# Altium footprint library My_Intlib.PcbLib: 224 footprints (part 4 of 14)
Each footprint in its own frame and in the unit in brackets; x right, y up, seen from the top. Pads: shape width x height; smd on the part's side, far side on the other; paste and mask are expansions set on the pad; w line width, h text height; cw(c..) or ccw(c..) is an arc to the next point about the centre after c.
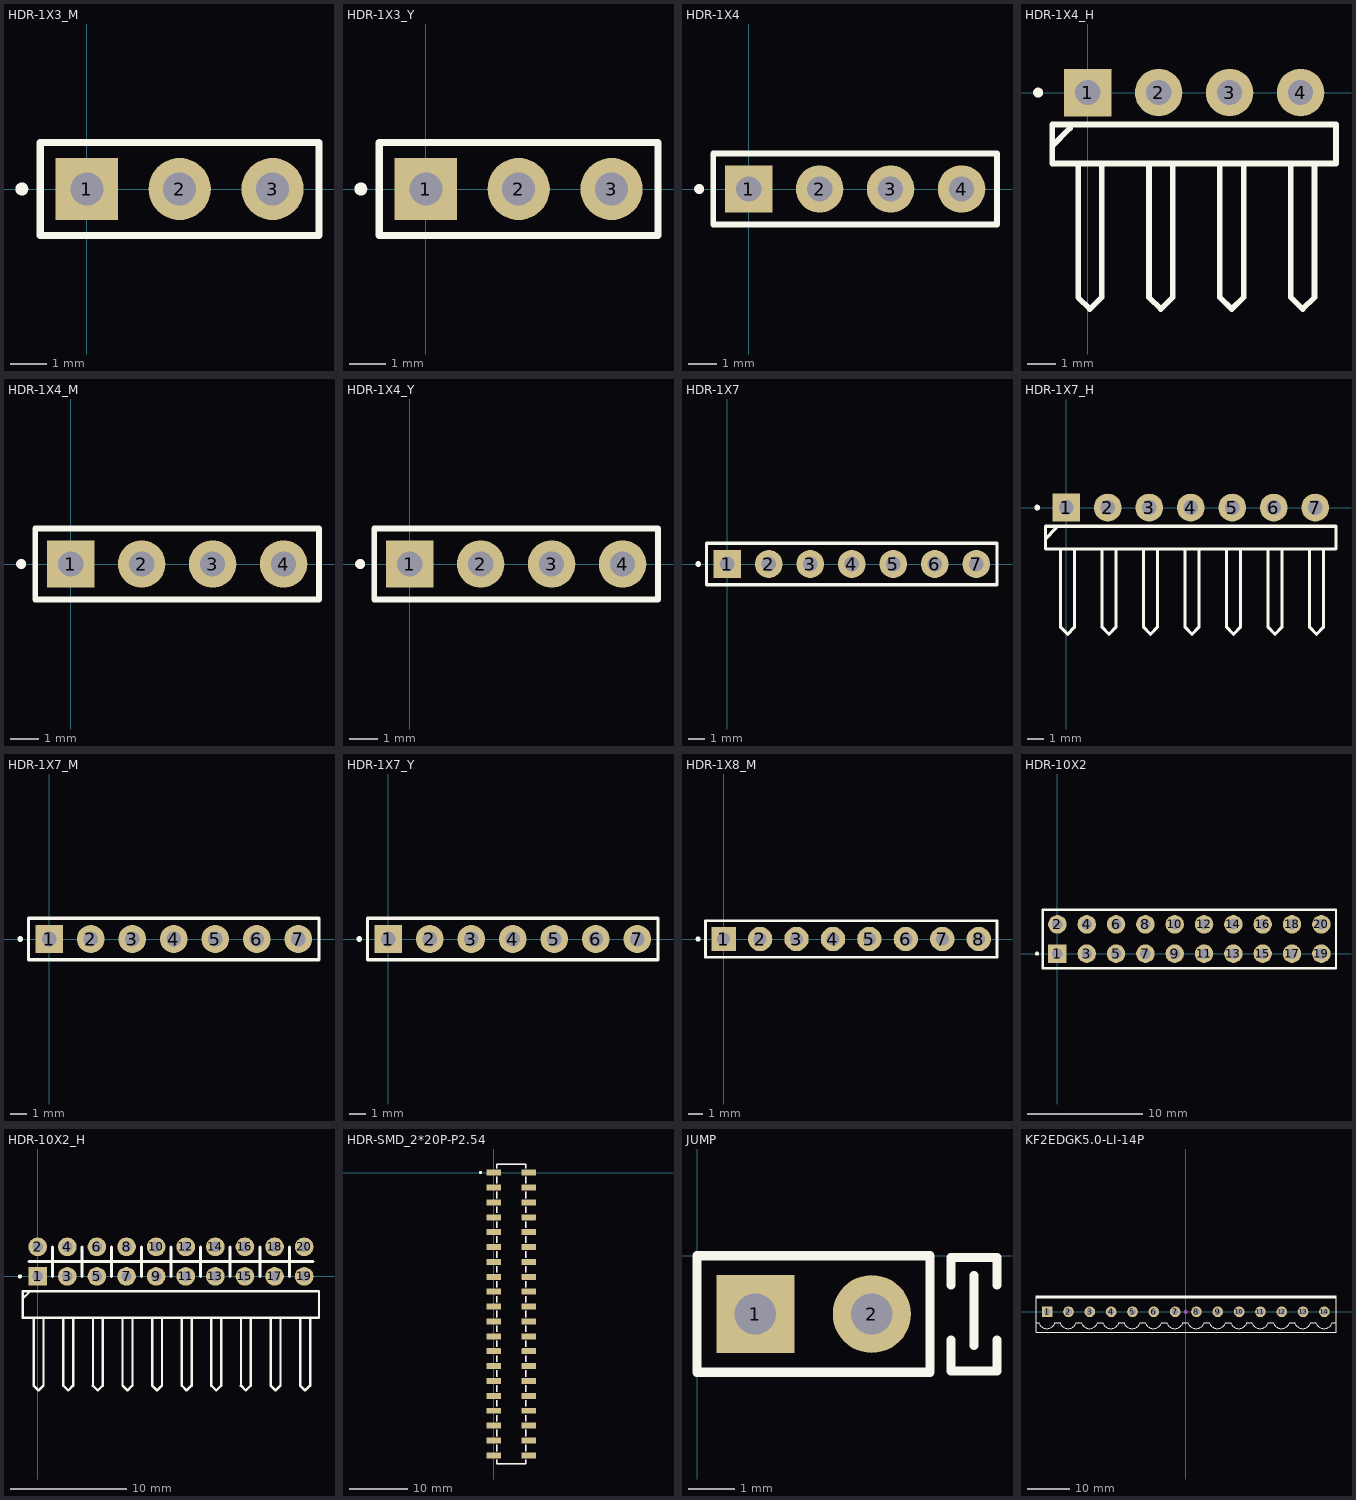
[diagram p3: the footprints below, top view; thin cyan lines are the x and y axes]

## HDR-1X3_M [mm]
pads (3):
  rect 1.7x1.7 hole 0.9: 1(0,0)
  round 1.7 hole 0.9: 2(2.54,0) 3(5.08,0)
Top Overlay:
  circle w0.203: c-1.778,0 r0.076
  lines w0.2: -1.27,-1.27 -1.27,1.27 6.35,1.27 6.35,-1.27 -1.27,-1.27
3D body "HDR2.54-1P_M.STEP": height 8.5, standoff -3, extent 3.81,-1.27 6.35,1.27
3D body "HDR2.54-1P_M.STEP": height 8.5, standoff -3, extent -1.27,-1.27 1.27,1.27
3D body "HDR2.54-1P_M.STEP": height 8.5, standoff -3, extent 1.27,-1.27 3.81,1.27

## HDR-1X3_Y [mm] "圆孔排母，3脚"
pads (3):
  rect 1.7x1.7 hole 0.9: 1(0,0)
  round 1.7 hole 0.9: 2(2.54,0) 3(5.08,0)
Top Overlay:
  circle w0.203: c-1.778,0 r0.076
  lines w0.2: -1.27,-1.27 -1.27,1.27 6.35,1.27 6.35,-1.27 -1.27,-1.27
3D body "HDR-1P_Y.STEP": height 4.31, standoff -3, extent 3.81,-1.27 6.35,1.27
3D body "HDR-1P_Y.STEP": height 4.31, standoff -3, extent 1.27,-1.27 3.81,1.27
3D body "HDR-1P_Y.STEP": height 4.31, standoff -3, extent -1.27,-1.27 1.27,1.27

## HDR-1X4 [mm] "排针，4脚"
pads (4):
  rect 1.7x1.7 hole 0.9: 1(0,0)
  round 1.7 hole 0.9: 2(2.54,0) 3(5.08,0) 4(7.62,0)
Top Overlay:
  circle w0.203: c-1.778,0 r0.076
  lines w0.2: -1.27,-1.27 -1.27,1.27 8.89,1.27 8.89,-1.27 -1.27,-1.27
3D body "HDR2.54-1P.STEP": height 8.5, standoff -3, extent -1.27,-1.27 1.27,1.27
3D body "HDR2.54-1P.STEP": height 8.5, standoff -3, extent 1.27,-1.27 3.81,1.27
3D body "HDR2.54-1P.STEP": height 8.5, standoff -3, extent 3.81,-1.27 6.35,1.27
3D body "HDR2.54-1P.STEP": height 8.5, standoff -3, extent 6.35,-1.27 8.89,1.27

## HDR-1X4_H [mm] "弯脚排针，4脚"
pads (4):
  rect 1.7x1.7 hole 0.9: 1(0,0)
  round 1.7 hole 0.9: 2(2.54,0) 3(5.08,0) 4(7.62,0)
Top Overlay:
  circle w0.203: c-1.778,0 r0.076
  lines w0.2: -1.27,-1.905 -0.635,-1.27 ; -0.348,-2.54 -0.348,-7.332 0.075,-7.755 0.499,-7.332 0.508,-7.323 ; 0.499,-7.323 0.499,-2.54 ; 2.192,-2.54 2.192,-7.332 2.615,-7.755 3.039,-7.332 ; 3.039,-7.323 3.039,-2.54 ; 4.732,-2.54 4.732,-7.332 5.155,-7.755 5.579,-7.332 ; 5.579,-7.323 5.579,-2.54 ; 7.272,-2.54 7.272,-7.332 7.695,-7.755 8.119,-7.332 ; 8.119,-7.323 8.119,-2.54 ; -1.27,-2.54 8.89,-2.54 8.89,-1.143 0.508,-1.143 -1.27,-1.143 -1.27,-2.54
3D body "HDR2.54-1P_H.STEP": height 4.85, standoff -3, extent 6.35,-7.77 8.89,1.27
3D body "HDR2.54-1P_H.STEP": height 4.85, standoff -3, extent 3.81,-7.77 6.35,1.27
3D body "HDR2.54-1P_H.STEP": height 4.85, standoff -3, extent 1.27,-7.77 3.81,1.27
3D body "HDR2.54-1P_H.STEP": height 4.85, standoff -3, extent -1.27,-7.77 1.27,1.27

## HDR-1X4_M [mm] "排母，4脚"
pads (4):
  rect 1.7x1.7 hole 0.9: 1(0,0)
  round 1.7 hole 0.9: 2(2.54,0) 3(5.08,0) 4(7.62,0)
Top Overlay:
  circle w0.203: c-1.778,0 r0.076
  lines w0.2: -1.27,-1.27 8.89,-1.27 8.89,1.27 -1.27,1.27 -1.27,-1.27
3D body "HDR2.54-1P_M.STEP": height 8.5, standoff -3, extent 3.81,-1.27 6.35,1.27
3D body "HDR2.54-1P_M.STEP": height 8.5, standoff -3, extent 6.35,-1.27 8.89,1.27
3D body "HDR2.54-1P_M.STEP": height 8.5, standoff -3, extent -1.27,-1.27 1.27,1.27
3D body "HDR2.54-1P_M.STEP": height 8.5, standoff -3, extent 1.27,-1.27 3.81,1.27

## HDR-1X4_Y [mm] "圆孔排母，4脚"
pads (4):
  rect 1.7x1.7 hole 0.9: 1(0,0)
  round 1.7 hole 0.9: 2(2.54,0) 3(5.08,0) 4(7.62,0)
Top Overlay:
  circle w0.203: c-1.778,0 r0.076
  lines w0.2: -1.27,-1.27 8.89,-1.27 8.89,1.27 -1.27,1.27 -1.27,-1.27
3D body "HDR-1P_Y.STEP": height 4.31, standoff -3, extent -1.27,-1.27 1.27,1.27
3D body "HDR-1P_Y.STEP": height 4.31, standoff -3, extent 1.27,-1.27 3.81,1.27
3D body "HDR-1P_Y.STEP": height 4.31, standoff -3, extent 3.81,-1.27 6.35,1.27
3D body "HDR-1P_Y.STEP": height 4.31, standoff -3, extent 6.35,-1.27 8.89,1.27

## HDR-1X7 [mm] "排针，8脚"
pads (7):
  rect 1.7x1.7 hole 0.9: 1(0,0)
  round 1.7 hole 0.9: 2(2.54,0) 3(5.08,0) 4(7.62,0) 5(10.16,0) 6(12.7,0) 7(15.24,0)
Top Overlay:
  circle w0.203: c-1.778,0 r0.076
  lines w0.2: -1.27,-1.27 -1.27,1.27 16.51,1.27 16.51,-1.27 -1.27,-1.27
3D body "HDR2.54-1P.STEP": height 8.5, standoff -3, extent -1.27,-1.27 1.27,1.27
3D body "HDR2.54-1P.STEP": height 8.5, standoff -3, extent 1.27,-1.27 3.81,1.27
3D body "HDR2.54-1P.STEP": height 8.5, standoff -3, extent 3.81,-1.27 6.35,1.27
3D body "HDR2.54-1P.STEP": height 8.5, standoff -3, extent 6.35,-1.27 8.89,1.27
3D body "HDR2.54-1P.STEP": height 8.5, standoff -3, extent 8.89,-1.27 11.43,1.27
3D body "HDR2.54-1P.STEP": height 8.5, standoff -3, extent 11.43,-1.27 13.97,1.27
3D body "HDR2.54-1P.STEP": height 8.5, standoff -3, extent 13.97,-1.27 16.51,1.27

## HDR-1X7_H [mm] "弯脚排针，7脚"
pads (7):
  rect 1.7x1.7 hole 0.9: 1(0,0)
  round 1.7 hole 0.9: 2(2.54,0) 3(5.08,0) 4(7.62,0) 5(10.16,0) 6(12.7,0) 7(15.24,0)
Top Overlay:
  circle w0.203: c-1.778,0 r0.076
  lines w0.2: -1.27,-1.905 -0.635,-1.27 ; -0.348,-2.54 -0.348,-7.332 0.075,-7.755 0.499,-7.332 0.508,-7.323 ; 0.499,-7.323 0.499,-2.54 ; 2.192,-2.54 2.192,-7.332 2.615,-7.755 3.039,-7.332 ; 3.039,-7.323 3.039,-2.54 ; 4.732,-2.54 4.732,-7.332 5.155,-7.755 5.579,-7.332 ; 5.579,-7.323 5.579,-2.54 ; 7.272,-2.54 7.272,-7.332 7.695,-7.755 8.119,-7.332 ; 8.119,-7.323 8.119,-2.54 ; 9.812,-2.54 9.812,-7.332 10.235,-7.755 10.659,-7.332 ; 10.659,-7.323 10.659,-2.54 ; 12.352,-2.54 12.352,-7.332 12.775,-7.755 13.199,-7.332 ; 13.199,-7.323 13.199,-2.54 ; 14.892,-2.54 14.892,-7.332 15.315,-7.755 15.739,-7.332 ; 15.739,-7.323 15.739,-2.54 ; -1.27,-2.54 16.51,-2.54 16.51,-1.143 0.508,-1.143 -1.27,-1.143 -1.27,-2.54
3D body "HDR2.54-1P_H.STEP": height 4.85, standoff -3, extent -1.27,-7.77 1.27,1.27
3D body "HDR2.54-1P_H.STEP": height 4.85, standoff -3, extent 1.27,-7.77 3.81,1.27
3D body "HDR2.54-1P_H.STEP": height 4.85, standoff -3, extent 3.81,-7.77 6.35,1.27
3D body "HDR2.54-1P_H.STEP": height 4.85, standoff -3, extent 6.35,-7.77 8.89,1.27
3D body "HDR2.54-1P_H.STEP": height 4.85, standoff -3, extent 8.89,-7.77 11.43,1.27
3D body "HDR2.54-1P_H.STEP": height 4.85, standoff -3, extent 11.43,-7.77 13.97,1.27
3D body "HDR2.54-1P_H.STEP": height 4.85, standoff -3, extent 13.97,-7.77 16.51,1.27

## HDR-1X7_M [mm]
pads (7):
  rect 1.7x1.7 hole 0.9: 1(0,0)
  round 1.7 hole 0.9: 2(2.54,0) 3(5.08,0) 4(7.62,0) 5(10.16,0) 6(12.7,0) 7(15.24,0)
Top Overlay:
  circle w0.203: c-1.778,0 r0.076
  lines w0.2: -1.27,-1.27 16.51,-1.27 16.51,1.27 -1.27,1.27 -1.27,-1.27
3D body "HDR2.54-1P_M.STEP": height 8.5, standoff -3, extent 3.81,-1.27 6.35,1.27
3D body "HDR2.54-1P_M.STEP": height 8.5, standoff -3, extent -1.27,-1.27 1.27,1.27
3D body "HDR2.54-1P_M.STEP": height 8.5, standoff -3, extent 1.27,-1.27 3.81,1.27
3D body "HDR2.54-1P_M.STEP": height 8.5, standoff -3, extent 11.43,-1.27 13.97,1.27
3D body "HDR2.54-1P_M.STEP": height 8.5, standoff -3, extent 6.35,-1.27 8.89,1.27
3D body "HDR2.54-1P_M.STEP": height 8.5, standoff -3, extent 8.89,-1.27 11.43,1.27
3D body "HDR2.54-1P_M.STEP": height 8.5, standoff -3, extent 13.97,-1.27 16.51,1.27

## HDR-1X7_Y [mm] "圆孔排母，7脚"
pads (7):
  rect 1.7x1.7 hole 0.9: 1(0,0)
  round 1.7 hole 0.9: 2(2.54,0) 3(5.08,0) 4(7.62,0) 5(10.16,0) 6(12.7,0) 7(15.24,0)
Top Overlay:
  circle w0.203: c-1.778,0 r0.076
  lines w0.2: -1.27,-1.27 16.51,-1.27 16.51,1.27 -1.27,1.27 -1.27,-1.27
3D body "HDR-1P_Y.STEP": height 4.31, standoff -3, extent -1.27,-1.27 1.27,1.27
3D body "HDR-1P_Y.STEP": height 4.31, standoff -3, extent 1.27,-1.27 3.81,1.27
3D body "HDR-1P_Y.STEP": height 4.31, standoff -3, extent 3.81,-1.27 6.35,1.27
3D body "HDR-1P_Y.STEP": height 4.31, standoff -3, extent 6.35,-1.27 8.89,1.27
3D body "HDR-1P_Y.STEP": height 4.31, standoff -3, extent 8.89,-1.27 11.43,1.27
3D body "HDR-1P_Y.STEP": height 4.31, standoff -3, extent 11.43,-1.27 13.97,1.27
3D body "HDR-1P_Y.STEP": height 4.31, standoff -3, extent 13.97,-1.27 16.51,1.27

## HDR-1X8_M [mm] "排母，8脚"
pads (8):
  rect 1.7x1.7 hole 0.9: 1(0,0)
  round 1.7 hole 0.9: 2(2.54,0) 3(5.08,0) 4(7.62,0) 5(10.16,0) 6(12.7,0) 7(15.24,0) 8(17.78,0)
Top Overlay:
  circle w0.203: c-1.778,0 r0.076
  lines w0.2: -1.27,-1.27 -1.27,1.27 19.05,1.27 19.05,-1.27 -1.27,-1.27
3D body "HDR2.54-1P_M.STEP": height 8.5, standoff -3, extent 13.97,-1.27 16.51,1.27
3D body "HDR2.54-1P_M.STEP": height 8.5, standoff -3, extent 8.89,-1.27 11.43,1.27
3D body "HDR2.54-1P_M.STEP": height 8.5, standoff -3, extent 6.35,-1.27 8.89,1.27
3D body "HDR2.54-1P_M.STEP": height 8.5, standoff -3, extent 11.43,-1.27 13.97,1.27
3D body "HDR2.54-1P_M.STEP": height 8.5, standoff -3, extent 1.27,-1.27 3.81,1.27
3D body "HDR2.54-1P_M.STEP": height 8.5, standoff -3, extent -1.27,-1.27 1.27,1.27
3D body "HDR2.54-1P_M.STEP": height 8.5, standoff -3, extent 3.81,-1.27 6.35,1.27
3D body "HDR2.54-1P_M.STEP": height 8.5, standoff -3, extent 16.51,-1.27 19.05,1.27

## HDR-10X2 [mm] "双排排针，10x2脚"
pads (20):
  rect 1.6x1.6 hole 0.9: 1(0,0)
  round 1.6 hole 0.9: 2(0,2.54) 3(2.54,0) 4(2.54,2.54) 5(5.08,0) 6(5.08,2.54) 7(7.62,0) 8(7.62,2.54) 9(10.16,0) 10(10.16,2.54) 11(12.7,0) 12(12.7,2.54) 13(15.24,0) 14(15.24,2.54) 15(17.78,0) 16(17.78,2.54) 17(20.32,0) 18(20.32,2.54) 19(22.86,0) 20(22.86,2.54)
Top Overlay:
  circle w0.203: c-1.778,0 r0.076
  lines w0.2: -1.27,-1.27 -1.27,3.81 24.13,3.81 24.13,-1.27 -1.27,-1.27
3D body "HDR2.54-1x2P.STEP": height 8.5, standoff -3, extent 8.89,-1.27 11.43,3.81
3D body "HDR2.54-1x2P.STEP": height 8.5, standoff -3, extent 1.27,-1.27 3.81,3.81
3D body "HDR2.54-1x2P.STEP": height 8.5, standoff -3, extent -1.27,-1.27 1.27,3.81
3D body "HDR2.54-1x2P.STEP": height 8.5, standoff -3, extent 6.35,-1.27 8.89,3.81
3D body "HDR2.54-1x2P.STEP": height 8.5, standoff -3, extent 3.81,-1.27 6.35,3.81
3D body "HDR2.54-1x2P.STEP": height 8.5, standoff -3, extent 21.59,-1.27 24.13,3.81
3D body "HDR2.54-1x2P.STEP": height 8.5, standoff -3, extent 13.97,-1.27 16.51,3.81
3D body "HDR2.54-1x2P.STEP": height 8.5, standoff -3, extent 11.43,-1.27 13.97,3.81
3D body "HDR2.54-1x2P.STEP": height 8.5, standoff -3, extent 19.05,-1.27 21.59,3.81
3D body "HDR2.54-1x2P.STEP": height 8.5, standoff -3, extent 16.51,-1.27 19.05,3.81

## HDR-10X2_H [mm]
pads (20):
  rect 1.6x1.6 hole 0.9: 1(0,0)
  round 1.6 hole 0.9: 2(0,2.54) 3(2.54,0) 4(2.54,2.54) 5(5.08,0) 6(5.08,2.54) 7(7.62,0) 8(7.62,2.54) 9(10.16,0) 10(10.16,2.54) 11(12.7,0) 12(12.7,2.54) 13(15.24,0) 14(15.24,2.54) 15(17.78,0) 16(17.78,2.54) 17(20.32,0) 18(20.32,2.54) 19(22.86,0) 20(22.86,2.54)
Top Overlay:
  circle w0.203: c-1.524,0 r0.076
  lines w0.2: -1.27,-1.905 -0.635,-1.27 ; -0.348,-9.364 0.075,-9.787 0.499,-9.364 0.508,-9.355 0.508,-3.556 ; -0.339,-9.364 -0.339,-3.556 ; 2.192,-9.364 2.615,-9.787 3.039,-9.364 ; 2.201,-9.364 2.201,-3.556 ; 3.048,-9.364 3.048,-3.556 ; 4.732,-9.364 5.155,-9.787 5.579,-9.364 ; 4.741,-9.364 4.741,-3.556 ; 5.588,-9.364 5.588,-3.556 ; 7.272,-9.364 7.695,-9.787 8.119,-9.364 ; 7.281,-9.364 7.281,-3.556 ; 8.128,-9.364 8.128,-3.556 ; 9.812,-9.364 10.235,-9.787 10.659,-9.364 ; 9.821,-9.364 9.821,-3.556 ; 10.668,-9.364 10.668,-3.556 ; 12.352,-9.364 12.775,-9.787 13.199,-9.364 ; 12.361,-9.364 12.361,-3.556 ; 13.208,-9.364 13.208,-3.556 ; 14.892,-9.364 15.315,-9.787 15.739,-9.364 ; 14.901,-9.364 14.901,-3.556 ; 15.748,-9.364 15.748,-3.556 ; 17.432,-9.364 17.855,-9.787 18.279,-9.364 ; 17.441,-9.364 17.441,-3.556 ; 18.288,-9.364 18.288,-3.556 ; 19.972,-9.364 20.395,-9.787 20.819,-9.364 ; 19.981,-9.364 19.981,-3.556 ; 20.828,-9.364 20.828,-3.556 ; 22.512,-9.364 22.935,-9.787 23.359,-9.364 ; 22.521,-9.364 22.521,-3.556 ; 23.368,-9.364 23.368,-3.556 ; -1.27,-3.556 -1.27,-1.27 24.13,-1.27 24.13,-3.556 -1.27,-3.556
  lines w0.254: -0.762,1.27 23.622,1.27 ; 1.27,0 1.27,2.54 ; 3.81,0 3.81,2.54 ; 6.35,0 6.35,2.54 ; 8.89,0 8.89,2.54 ; 11.43,0 11.43,2.54 ; 13.97,0 13.97,2.54 ; 16.51,0 16.51,2.54 ; 19.05,0 19.05,2.54 ; 21.59,0 21.59,2.54
Bottom Overlay:
  lines w0.254: -0.762,1.27 23.622,1.27 ; 1.27,0 1.27,2.54 ; 3.81,0 3.81,2.54 ; 6.35,0 6.35,2.54 ; 8.89,0 8.89,2.54 ; 11.43,0 11.43,2.54 ; 13.97,0 13.97,2.54 ; 16.51,0 16.51,2.54 ; 19.05,0 19.05,2.54 ; 21.59,0 21.59,2.54
3D body "HDR-1x2_H.STEP": height 5.1, standoff -3, extent 8.89,-9.96 11.43,2.89
3D body "HDR-1x2_H.STEP": height 5.1, standoff -3, extent 3.81,-9.96 6.35,2.89
3D body "HDR-1x2_H.STEP": height 5.1, standoff -3, extent 6.35,-9.96 8.89,2.89
3D body "HDR-1x2_H.STEP": height 5.1, standoff -3, extent -1.27,-9.96 1.27,2.89
3D body "HDR-1x2_H.STEP": height 5.1, standoff -3, extent 1.27,-9.96 3.81,2.89
3D body "HDR-1x2_H.STEP": height 5.1, standoff -3, extent 21.59,-9.96 24.13,2.89
3D body "HDR-1x2_H.STEP": height 5.1, standoff -3, extent 16.51,-9.96 19.05,2.89
3D body "HDR-1x2_H.STEP": height 5.1, standoff -3, extent 19.05,-9.96 21.59,2.89
3D body "HDR-1x2_H.STEP": height 5.1, standoff -3, extent 11.43,-9.96 13.97,2.89
3D body "HDR-1x2_H.STEP": height 5.1, standoff -3, extent 13.97,-9.96 16.51,2.89

## HDR-SMD_2*20P-P2.54 [mm] "贴片式排母，2*20p，脚距2.54mm，高度8.5mm"
pads (40):
  rrect15% 2.5x1.02 smd paste+0: 1(0,0) 2(6,0) 3(0,-2.54) 4(6,-2.54) 5(0,-5.08) 6(6,-5.08) 7(0,-7.62) 8(6,-7.62) 9(0,-10.16) 10(6,-10.16) 11(0,-12.7) 12(6,-12.7) 13(0,-15.24) 14(6,-15.24) 15(0,-17.78) 16(6,-17.78) 17(0,-20.32) 18(6,-20.32) 19(0,-22.86) 20(6,-22.86) 21(0,-25.4) 22(6,-25.4) 23(0,-27.94) 24(6,-27.94) 25(0,-30.48) 26(6,-30.48) 27(0,-33.02) 28(6,-33.02) 29(0,-35.56) 30(6,-35.56) 31(0,-38.1) 32(6,-38.1) 33(0,-40.64) 34(6,-40.64) 35(0,-43.18) 36(6,-43.18) 37(0,-45.72) 38(6,-45.72) 39(0,-48.26) 40(6,-48.26)
Top Overlay:
  circle w0.279: c-2.235,0 r0.127
  lines w0.254: 0.5,-49.001 0.5,-49.73 5.5,-49.73 5.5,-49.001 ; 0.5,-47.519 0.5,-46.461 ; 0.5,-44.979 0.5,-43.921 ; 0.5,-42.439 0.5,-41.381 ; 0.5,-39.899 0.5,-38.841 ; 0.5,-37.359 0.5,-36.301 ; 0.5,-34.819 0.5,-33.761 ; 0.5,-32.279 0.5,-31.221 ; 0.5,-29.739 0.5,-28.681 ; 0.5,-27.199 0.5,-26.141 ; 0.5,-24.659 0.5,-23.601 ; 0.5,-22.119 0.5,-21.061 ; 0.5,-19.579 0.5,-18.521 ; 0.5,-17.039 0.5,-15.981 ; 0.5,-14.499 0.5,-13.441 ; 0.5,-11.959 0.5,-10.901 ; 0.5,-9.419 0.5,-8.361 ; 0.5,-6.879 0.5,-5.821 ; 0.5,-4.339 0.5,-3.281 ; 0.5,-1.799 0.5,-0.741 ; 0.5,0.741 0.5,1.47 5.5,1.47 5.5,0.741 ; 5.5,-47.519 5.5,-46.461 ; 5.5,-44.979 5.5,-43.921 ; 5.5,-42.439 5.5,-41.381 ; 5.5,-39.899 5.5,-38.841 ; 5.5,-37.359 5.5,-36.301 ; 5.5,-34.819 5.5,-33.761 ; 5.5,-32.279 5.5,-31.221 ; 5.5,-29.739 5.5,-28.681 ; 5.5,-27.199 5.5,-26.141 ; 5.5,-24.659 5.5,-23.601 ; 5.5,-22.119 5.5,-21.061 ; 5.5,-19.579 5.5,-18.521 ; 5.5,-17.039 5.5,-15.981 ; 5.5,-14.499 5.5,-13.441 ; 5.5,-11.959 5.5,-10.901 ; 5.5,-9.419 5.5,-8.361 ; 5.5,-6.879 5.5,-5.821 ; 5.5,-4.339 5.5,-3.281 ; 5.5,-1.799 5.5,-0.741
Top Value:
  text ".Comment" at 8.687,-1.678 h0.89
Top Assembly:
  circle w0.279: c-2.235,0 r0.127
  lines w0.254: 0.5,-49.001 0.5,-49.73 5.5,-49.73 5.5,-49.001 ; 0.5,-47.519 0.5,-46.461 ; 0.5,-44.979 0.5,-43.921 ; 0.5,-42.439 0.5,-41.381 ; 0.5,-39.899 0.5,-38.841 ; 0.5,-37.359 0.5,-36.301 ; 0.5,-34.819 0.5,-33.761 ; 0.5,-32.279 0.5,-31.221 ; 0.5,-29.739 0.5,-28.681 ; 0.5,-27.199 0.5,-26.141 ; 0.5,-24.659 0.5,-23.601 ; 0.5,-22.119 0.5,-21.061 ; 0.5,-19.579 0.5,-18.521 ; 0.5,-17.039 0.5,-15.981 ; 0.5,-14.499 0.5,-13.441 ; 0.5,-11.959 0.5,-10.901 ; 0.5,-9.419 0.5,-8.361 ; 0.5,-6.879 0.5,-5.821 ; 0.5,-4.339 0.5,-3.281 ; 0.5,-1.799 0.5,-0.741 ; 0.5,0.741 0.5,1.47 5.5,1.47 5.5,0.741 ; 5.5,-47.519 5.5,-46.461 ; 5.5,-44.979 5.5,-43.921 ; 5.5,-42.439 5.5,-41.381 ; 5.5,-39.899 5.5,-38.841 ; 5.5,-37.359 5.5,-36.301 ; 5.5,-34.819 5.5,-33.761 ; 5.5,-32.279 5.5,-31.221 ; 5.5,-29.739 5.5,-28.681 ; 5.5,-27.199 5.5,-26.141 ; 5.5,-24.659 5.5,-23.601 ; 5.5,-22.119 5.5,-21.061 ; 5.5,-19.579 5.5,-18.521 ; 5.5,-17.039 5.5,-15.981 ; 5.5,-14.499 5.5,-13.441 ; 5.5,-11.959 5.5,-10.901 ; 5.5,-9.419 5.5,-8.361 ; 5.5,-6.879 5.5,-5.821 ; 5.5,-4.339 5.5,-3.281 ; 5.5,-1.799 5.5,-0.741
  text ".Designator" at 8.687,-0.884 h0.89
3D body "HDR-SMD.STEP": height 8.88, standoff -0.02, extent -0.559,-49.728 6.541,1.473

## JUMP [mm]
pads (2):
  rect 1.7x1.7 hole 0.9: 1(1.27,-1.27)
  round 1.7 hole 0.9: 2(3.81,-1.27)
Top Overlay:
  lines w0.2: 5.539,-1.84 5.539,-2.512 6.539,-2.512 6.539,-1.84 ; 5.539,-0.64 5.539,-0.04 6.539,-0.04 6.539,-0.64 ; 6.041,-1.958 6.041,-0.433 ; 0,-2.54 5.08,-2.54 5.08,0 0,0 0,-2.54
3D body "HDR2.54-1P.STEP": height 8.5, standoff -3, extent 0,-2.54 2.54,0
3D body "HDR2.54-1P.STEP": height 8.5, standoff -3, extent 2.54,-2.54 5.08,0
3D body "跳线帽.STEP": height 8.54, standoff 2.54, extent 0,-2.54 5.08,0

## KF2EDGK5.0-LI-14P [mm] "立插端子"
pads (14):
  rect 2.5x2.5 hole 1.6: 1(-32.5,0)
  round 2.5 hole 1.6: 2(-27.5,0) 3(-22.5,0) 4(-17.5,0) 5(-12.5,0) 6(-7.5,0) 7(-2.5,0) 8(2.5,0) 9(7.5,0) 10(12.5,0) 11(17.5,0) 12(22.5,0) 13(27.5,0) 14(32.5,0)
Top Overlay:
  lines w0.254: -35.12,-2.54 -34.485,-2.54 ccw(c-32.58,-1.905) -30.675,-2.54 -29.485,-2.54 ccw(c-27.58,-1.905) -25.675,-2.54 -24.485,-2.54 ccw(c-22.58,-1.905) -20.675,-2.54 -19.485,-2.54 ccw(c-17.58,-1.905) -15.675,-2.54 -14.485,-2.54 ccw(c-12.58,-1.905) -10.675,-2.54 -9.485,-2.54 ccw(c-7.58,-1.905) -5.675,-2.54 ; -35.12,3.302 5.092,3.302 ; -35.12,3.556 5.219,3.556 ; -5.675,-2.54 -4.485,-2.54 ccw(c-2.58,-1.905) -0.675,-2.54 0.515,-2.54 ccw(c2.42,-1.905) 4.325,-2.54 ; 4.913,3.302 10.219,3.302 ; 5,3.556 10.219,3.556 ; 5,3.81 10.219,3.81 ; 5.167,-2.54 4.325,-2.54 ; 5.219,3.81 -35.12,3.81 -35.12,-4.826 5.219,-4.826 10.219,-4.826 15.219,-4.826 20.219,-4.826 25.219,-4.826 30.219,-4.826 35.219,-4.826 35.219,3.81 30,3.81 ; 9.913,3.302 15.219,3.302 ; 10,3.556 15.219,3.556 ; 10,3.81 15.219,3.81 ; 14.913,3.302 20.219,3.302 ; 15,3.556 20.219,3.556 ; 15,3.81 20.219,3.81 ; 19.913,3.302 25.219,3.302 ; 20,3.556 25.219,3.556 ; 20,3.81 25.219,3.81 ; 24.913,3.302 30.219,3.302 ; 25,3.556 30.219,3.556 ; 25,3.81 30.219,3.81 ; 29.913,3.302 35.219,3.302 ; 30,3.556 35.219,3.556 ; 4.325,-2.54 5.515,-2.54 ccw(c7.42,-1.905) 9.325,-2.54 ; 9.325,-2.54 10.167,-2.54 9.325,-2.54 ; 9.325,-2.54 10.515,-2.54 ccw(c12.42,-1.905) 14.325,-2.54 ; 14.325,-2.54 15.167,-2.54 14.325,-2.54 ; 14.325,-2.54 15.515,-2.54 ccw(c17.42,-1.905) 19.325,-2.54 ; 19.325,-2.54 20.167,-2.54 19.325,-2.54 ; 19.325,-2.54 20.515,-2.54 ccw(c22.42,-1.905) 24.325,-2.54 ; 24.325,-2.54 25.167,-2.54 24.325,-2.54 ; 24.325,-2.54 25.515,-2.54 ccw(c27.42,-1.905) 29.325,-2.54 ; 29.325,-2.54 30.167,-2.54 29.325,-2.54 ; 29.325,-2.54 30.515,-2.54 ccw(c32.42,-1.905) 34.325,-2.54 ; 34.325,-2.54 35.167,-2.54 34.325,-2.54
Mechanical 15:
  circle w0.05: c0,0 r0.35
  lines w0.05: -0.5,0 0.5,0 ; 0,-0.5 0,0.5
3D body "KF2EDGK-1P.STEP": height 11.25, standoff -2.95, extent 4.96,-4.75 10.04,3.75
3D body "KF2EDGK-1P.STEP": height 11.25, standoff -2.95, extent -0.04,-4.75 5.04,3.75
3D body "KF2EDGK-1P.STEP": height 11.25, standoff -2.95, extent -5.04,-4.75 0.04,3.75
3D body "KF2EDGK-1P.STEP": height 11.25, standoff -2.95, extent -10.04,-4.75 -4.96,3.75
3D body "KF2EDGK-1P.STEP": height 11.25, standoff -2.95, extent -15.04,-4.75 -9.96,3.75
3D body "KF2EDGK-1P.STEP": height 11.25, standoff -2.95, extent -20.04,-4.75 -14.96,3.75
3D body "KF2EDGK-1P.STEP": height 11.25, standoff -2.95, extent -25.04,-4.75 -19.96,3.75
3D body "KF2EDGK-1P.STEP": height 11.25, standoff -2.95, extent -30.04,-4.75 -24.96,3.75
3D body "KF2EDGK-1P.STEP": height 11.25, standoff -2.95, extent -35.04,-4.75 -29.96,3.75
3D body "KF2EDGK-1P.STEP": height 11.25, standoff -2.95, extent 9.96,-4.75 15.04,3.75
3D body "KF2EDGK-1P.STEP": height 11.25, standoff -2.95, extent 14.96,-4.75 20.04,3.75
3D body "KF2EDGK-1P.STEP": height 11.25, standoff -2.95, extent 19.96,-4.75 25.04,3.75
3D body "KF2EDGK-1P.STEP": height 11.25, standoff -2.95, extent 24.96,-4.75 30.04,3.75
3D body "KF2EDGK-1P.STEP": height 11.25, standoff -2.95, extent 29.96,-4.75 35.04,3.75